# Altium footprint library picoprint_library.PcbLib: 102 footprints (part 1 of 7)
Each footprint in its own frame and in the unit in brackets; x right, y up, seen from the top. Pads: shape width x height; smd on the part's side, far side on the other; paste and mask are expansions set on the pad; w line width, h text height; cw(c..) or ccw(c..) is an arc to the next point about the centre after c.
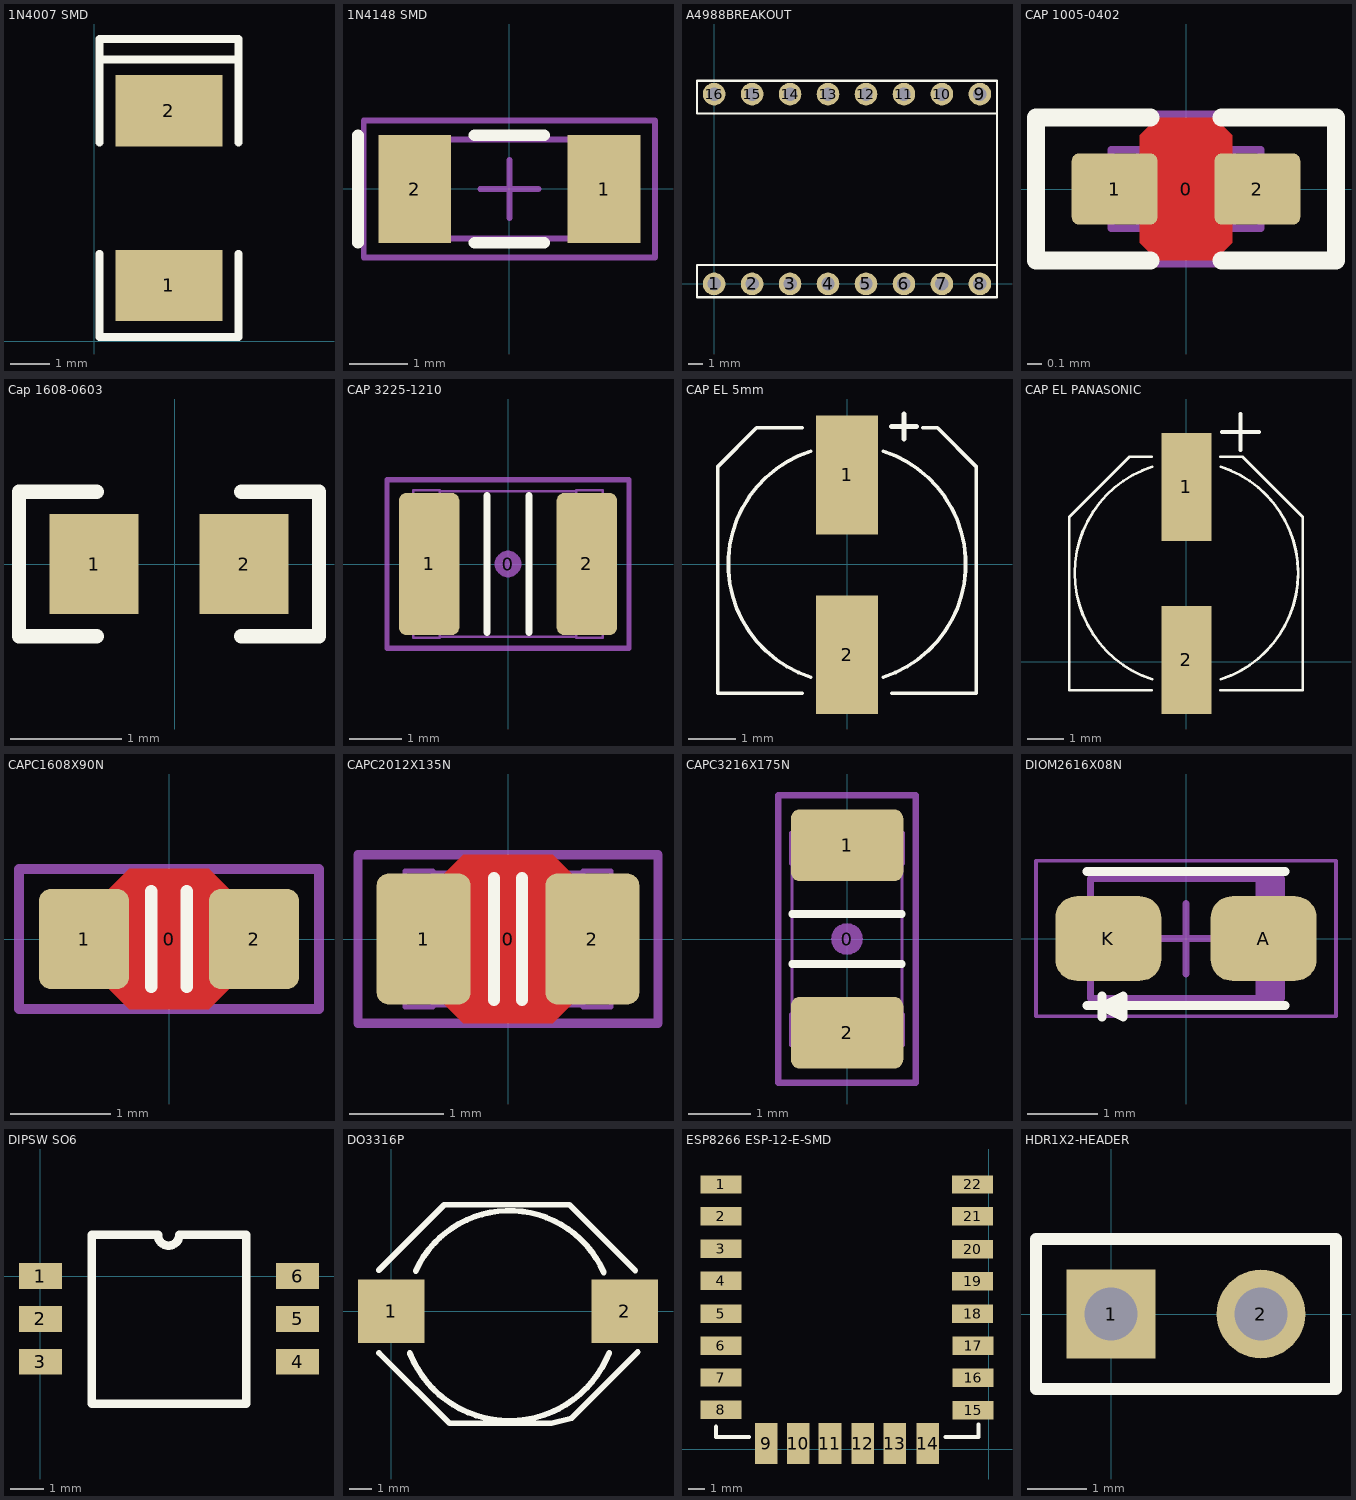
[diagram p0: the footprints below, top view; thin cyan lines are the x and y axes]

## 1N4007 SMD [mm]
pads (2):
  rect 2.7x1.8 smd: 1(1.88,1.407) 2(1.88,5.807)
Top Overlay:
  lines w0.2: 0.13,2.207 0.13,0.107 3.63,0.107 3.63,2.207 ; 0.13,5.007 0.13,7.107 3.63,7.107 3.63,5.007 ; 0.13,6.782 0.13,7.62 3.63,7.62 3.63,6.706
3D body "DO-214AC.stp": height 2.9, standoff 0, extent 0.405,0.839 3.355,6.439

## 1N4148 SMD [mm]
pads (2):
  rect 1.25x1.85 smd: 1(1.625,0) 2(-1.625,0)
Top Overlay:
  lines w0.2: -2.6,-0.925 -2.6,0.925 ; -0.6,-0.925 0.6,-0.925 ; -0.6,0.925 0.6,0.925
Mechanical 13:
  rectangle: -1.85,-0.85 -1.352,0.85
  lines w0.1: -1.85,-0.85 1.85,-0.85 1.85,0.85 -1.85,0.85 -1.85,-0.85
Mechanical 15:
  lines w0.1: -0.5,0 0.5,0 ; 0,-0.5 0,0.5 ; -2.5,-1.175 2.5,-1.175 2.5,1.175 -2.5,1.175 -2.5,-1.175
3D body: height 1.7, standoff 0, extent -1.85,-0.85 1.85,0.85

## A4988BREAKOUT [mm]
pads (16):
  round 1.51 hole 0.9: 1(0,0) 2(2.54,0) 3(5.08,0) 4(7.62,0) 5(10.16,0) 6(12.7,0) 7(15.24,0) 8(17.78,0) 9(17.78,12.7) 10(15.24,12.7) 11(12.7,12.7) 12(10.16,12.7) 13(7.62,12.7) 14(5.08,12.7) 15(2.54,12.7) 16(0,12.7)
Top Overlay:
  lines w0.15: -1.143,1.27 18.898,1.27 ; -1.143,11.405 18.923,11.405
  lines w0.152: -1.143,1.27 -1.143,-0.889 18.923,-0.889 18.923,13.589 -1.143,13.589 -1.143,11.405
Mechanical 15:
  text "Vmot" at 0.22,9.305 h0.61
  text "GND" at 2.788,9.305 h0.61
  text "2B" at 5.356,9.305 h0.61
  text "2A" at 7.924,9.305 h0.61
  text "1A" at 10.491,9.305 h0.61
  text "1B" at 13.059,9.305 h0.61
  text "VDD" at 15.627,9.305 h0.61
  text "GND" at 18.195,9.305 h0.61
  text "EN" at 0.31,1.27 h0.61
  text "MS1" at 2.85,1.27 h0.61
  text "MS2" at 5.39,1.27 h0.61
  text "MS3" at 7.93,1.27 h0.61
  text "RST" at 10.47,1.27 h0.61
  text "SLP" at 13.01,1.27 h0.61
  text "STEP" at 15.55,1.27 h0.61
  text "DIR" at 18.09,1.27 h0.61
3D body "FemaleHeader8.STEP": height 8.5, standoff -2.09, extent -1.27,11.369 19.05,13.909
3D body "FemaleHeader8.STEP": height 8.5, standoff -2.09, extent -1.27,-1.331 19.05,1.209

## CAP 1005-0402 [mm] "Chip Capacitor, Body 1.0x0.5mm, EIA 0402, IPC Medium Density"
height 0.55
pads (3):
  round 0.2 on Mech15: 0(0,0)
  rrect20% 0.6x0.5 smd: 1(-0.5,0) 2(0.5,0)
Top Layer:
  pour cut-out: -0.325,0.375 -0.2,0.5 0.2,0.5 0.325,0.375 0.325,-0.375 0.2,-0.5 -0.2,-0.5 -0.325,-0.375
Top Overlay:
  lines w0.127: -0.25,-0.5 -1.05,-0.5 -1.05,0.5 -0.25,0.5 ; 0.25,-0.5 1.05,-0.5 1.05,0.5 0.25,0.5
Mechanical 13:
  lines w0.05: -0.325,-0.255 0.325,-0.255 ; -0.325,0.255 0.325,0.255 ; -0.525,-0.275 -0.325,-0.275 -0.325,0.275 -0.525,0.275 -0.525,-0.275 ; 0.325,-0.275 0.325,0.275 0.525,0.275 0.525,-0.275 0.325,-0.275
Mechanical 15:
  lines w0.1: -1.05,-0.5 1.05,-0.5 1.05,0.5 -1.05,0.5 -1.05,-0.5
3D body "CAP 0402 (1005 metric).STEP": height 0.55, standoff 0, extent -0.525,-0.275 0.525,0.275

## Cap 1608-0603 [mm]
pads (2):
  rect 0.8x0.9 smd: 1(-0.725,0) 2(0.625,0)
Top Overlay:
  lines w0.127: -0.7,-0.65 -1.4,-0.65 -1.4,0.65 -0.7,0.65 ; 0.6,-0.65 1.3,-0.65 1.3,0.65 0.6,0.65
3D body "CAP0603.STEP": height 0.4, standoff 0, extent -0.8,-0.4 0.8,0.4

## CAP 3225-1210 [mm] "Chip Capacitor, Body 3.2x2.5mm, EIA 1210, IPC Medium Density"
height 2.2
pads (3):
  round 0.508 on Mech15: 0(0,0)
  rrect25% 1.15x2.7 smd: 1(-1.5,0) 2(1.5,0)
Top Overlay:
  lines w0.127: -0.4,-1.3 -0.4,1.3 ; 0.4,-1.3 0.4,1.3
Mechanical 13:
  lines w0.05: -1.3,-1.38 1.3,-1.38 ; -1.3,1.38 1.3,1.38 ; -1.8,-1.4 -1.8,1.4 -1.3,1.4 -1.3,-1.4 -1.8,-1.4 ; 1.3,-1.4 1.8,-1.4 1.8,1.4 1.3,1.4 1.3,-1.4
Mechanical 15:
  lines w0.1: -2.3,-1.6 2.3,-1.6 2.3,1.6 -2.3,1.6 -2.3,-1.6
3D body "CAP_1210.STEP": height 2.19, standoff -0.01, extent -1.8,-1.4 1.8,1.4

## CAP EL 5mm [mm]
height 5.2
pads (2):
  rect 1.3x2.5 smd: 1(0,1.88) 2(0,-1.905)
Top Overlay:
  lines w0.076: -0.94,-2.717 -2.718,-2.717 -2.718,1.549 -2.718,2.057 -1.904,2.871 -0.94,2.871 ; -0.766,-2.38 cw(c0,0) -0.766,2.38 ; 0.766,-2.38 ccw(c0,0) 0.766,2.38 ; 0.94,-2.717 2.718,-2.717 2.718,1.549 2.718,2.057 1.904,2.871 1.6,2.871
  lines w0.1: 0.937,2.9 1.463,2.9 ; 1.2,2.637 1.2,3.163
3D body "CAPAE-D5.0x5.4.stp": height 5.5, standoff 0, extent -2.75,-3.25 2.75,3.25

## CAP EL PANASONIC [mil]
pads (2):
  rect 55x118 smd: 1(0,190.97) 2(0,1.97)
Top Overlay:
  lines w3: -38,-31.03 -128,-31.03 ; -38,223.97 -62,223.97 ; -37.4,-19.16 cw(c0,96.97) -37.4,213.1 ; 37,-31.03 127,-31.03 ; 37,223.97 61,223.97 ; 37.4,-19.16 ccw(c0,96.97) 37.4,213.1 ; -128,-31.03 -128,157.97 ; -128,-31.03 -128,157.97 ; -128,157.97 -62,223.97 ; -128,157.97 -62,223.97 ; 61,223.97 127,157.97 ; 61,223.97 127,157.97 ; 127,-31.03 127,157.97 ; 127,-31.03 127,157.97
  lines w3.94: 38.38,250.98 79.72,250.98 ; 59.05,231.3 59.05,270.67
3D body "CAPAE-D6.3x5.4.stp": height 216.54, standoff 0, extent -133.85,-56.93 133.87,250.15

## CAPC1608X90N [mm] "Chip Capacitor, Body 1.6x0.8mm, EIA 0603, IPC Medium Density"
height 0.9
pads (3):
  round 0.254 on Mech15: 0(0,0)
  rrect25% 0.9x1 smd: 1(-0.85,0) 2(0.85,0)
Top Layer:
  pour cut-out: -0.6,0.5 -0.4,0.7 0.4,0.7 0.6,0.5 0.6,-0.5 0.4,-0.7 -0.4,-0.7 -0.6,-0.5
Top Overlay:
  lines w0.127: -0.178,-0.476 -0.178,0.476 ; 0.178,-0.476 0.178,0.476
Mechanical 13:
  lines w0.05: -0.55,-0.43 0.55,-0.43 ; -0.55,0.43 0.55,0.43 ; -0.85,-0.45 -0.55,-0.45 -0.55,0.45 -0.85,0.45 -0.85,-0.45 ; 0.55,-0.45 0.85,-0.45 0.85,0.45 0.55,0.45 0.55,-0.45
Mechanical 15:
  lines w0.1: -1.5,-0.7 1.5,-0.7 1.5,0.7 -1.5,0.7 -1.5,-0.7
3D body "CAP_0603.STEP": height 0.89, standoff -0.01, extent -0.85,-0.45 0.85,0.45

## CAPC2012X135N [mm] "Chip Capacitor, Body 2.0x1.2mm, EIA 0805, IPC Medium Density"
height 1.35
pads (3):
  round 0.254 on Mech15: 0(0,0)
  rrect25% 1x1.4 smd: 1(-0.9,0) 2(0.9,0)
Top Layer:
  pour cut-out: -0.675,0.7 -0.475,0.9 0.475,0.9 0.675,0.7 0.675,-0.7 0.475,-0.9 -0.475,-0.9 -0.675,-0.7
Top Overlay:
  lines w0.127: -0.15,-0.651 -0.15,0.651 ; 0.15,-0.651 0.15,0.651
Mechanical 13:
  lines w0.05: -0.8,-0.705 0.8,-0.705 ; -0.8,0.705 0.8,0.705 ; -1.1,-0.725 -0.8,-0.725 -0.8,0.725 -1.1,0.725 -1.1,-0.725 ; 0.8,-0.725 0.8,0.725 1.1,0.725 1.1,-0.725 0.8,-0.725
Mechanical 15:
  lines w0.1: -1.6,-0.9 1.6,-0.9 1.6,0.9 -1.6,0.9 -1.6,-0.9
3D body "CAP_0805.STEP": height 1.34, standoff -0.01, extent -1.1,-0.725 1.1,0.725

## CAPC3216X175N [mm]
height 2
pads (3):
  round 0.508 on Mech15: 0(0,0)
  rrect25% 1.8x1.15 smd: 1(0,1.5) 2(0,-1.5)
Top Overlay:
  lines w0.127: -0.876,-0.4 0.876,-0.4 ; -0.876,0.4 0.876,0.4
Mechanical 13:
  lines w0.05: -0.88,-1.2 -0.88,1.2 ; 0.88,-1.2 0.88,1.2 ; -0.9,-1.7 0.9,-1.7 0.9,-1.2 -0.9,-1.2 -0.9,-1.7 ; -0.9,1.2 0.9,1.2 0.9,1.7 -0.9,1.7 -0.9,1.2
Mechanical 15:
  lines w0.1: -1.1,-2.3 -1.1,2.3 1.1,2.3 1.1,-2.3 -1.1,-2.3
3D body "CAPC3216X175N - 1206 (3216 metric).STEP": height 1.75, standoff 0, extent -0.9,-1.7 0.9,1.7

## DIOM2616X08N [mm] "Molded Diode, 2-Leads, Body 2.60x1.60mm, IPC Medium Density"
height 0.85
pads (2):
  rrect50% 1.5x1.2 smd: A(1.1,0) K(-1.1,0)
Top Overlay:
  lines w0.127: -1.4,-0.95 1.4,-0.95 ; -1.4,0.95 1.4,0.95 ; -1.189,-1.112 -1.189,-0.812 ; -0.889,-0.962 -1.189,-0.962 ; -1.189,-0.962 -0.889,-0.812 -0.889,-1.112 -1.189,-0.962
Mechanical 13:
  rectangle: 0.987,-0.85 1.35,0.85
  lines w0.1: -1.35,-0.85 1.35,-0.85 1.35,0.85 -1.35,0.85 -1.35,-0.85
Mechanical 15:
  lines w0.05: -2.125,-1.1 2.125,-1.1 2.125,1.1 -2.125,1.1 -2.125,-1.1
  lines w0.1: -0.5,0 0.5,0 ; 0,-0.5 0,0.5
3D body: height 0.85, standoff 0, extent -1.35,-0.85 1.35,0.85

## DIPSW SO6 [mil]
pads (6):
  rect 50x30 smd: 1(0,0) 2(0,-50) 3(0,-100) 4(300,-100) 5(300,-50) 6(300,0)
Top Overlay:
  lines w10: 60,-148.85 60,48 137.5,48 ; 60,33 60,-149 240,-149 240,47 ; 137,48 ccw(c149.5,48) 162,48 ; 162.5,48 240,48

## DO3316P [mm]
pads (2):
  rect 2.92x2.79 smd: 1(0,0) 2(10.29,0)
Top Overlay:
  lines w0.254: -0.546,1.816 2.337,4.699 3.285,4.699 6.985,4.699 7.849,4.699 10.744,1.803 ; -0.533,-1.829 2.566,-4.929 3.355,-4.929 7.055,-4.929 7.949,-4.7 10.858,-1.791 ; 0.821,-1.833 ccw(c5.207,-0.102) 9.598,-1.818 ; 1.08,1.784 cw(c5.207,-0.102) 9.366,1.713

## ESP8266 ESP-12-E-SMD [mil] "ESP8266 ESP-12-E"
height 86.61
pads (22):
  rect 100x45 smd: 1(-653,646) 2(-653,568) 3(-653,489) 4(-653,411) 5(-653,331) 6(-653,253) 7(-653,175) 8(-653,96) 15(-38,95) 16(-38,174) 17(-38,252) 18(-39,331) 19(-39,410) 20(-39,488) 21(-39,568) 22(-39,646)
  rect 55x100 smd: 9(-543,14) 10(-465,14) 11(-387,14) 12(-307,14) 13(-229,14) 14(-149,14)
Top Overlay:
  lines w10: -665,55 -665,30 -585,30 ; -105,30 -25,30 -25,60
3D body "User Library-ESP_12_E.STEP": height 85.7, standoff -1.17, extent -658,28.56 -28.08,973.44

## HDR1X2-HEADER [mm]
pads (2):
  rect 1.5x1.5 hole 0.9: 1(0,0)
  round 1.5 hole 0.9: 2(2.54,0)
Top Overlay:
  lines w0.2: -1.27,-1.27 -1.27,1.27 3.81,1.27 3.81,-1.27 -1.27,-1.27
3D body "DS1021-1x2SF11.stp": height 8.6, standoff -3, extent -1.27,-1.27 3.81,1.27